# Altium footprint library smd-ipc.PCBLIB: 363 footprints (part 8 of 27)
Each footprint in its own frame and in the unit in brackets; x right, y up, seen from the top. Pads: shape width x height; smd on the part's side, far side on the other; paste and mask are expansions set on the pad; w line width, h text height; cw(c..) or ccw(c..) is an arc to the next point about the centre after c.
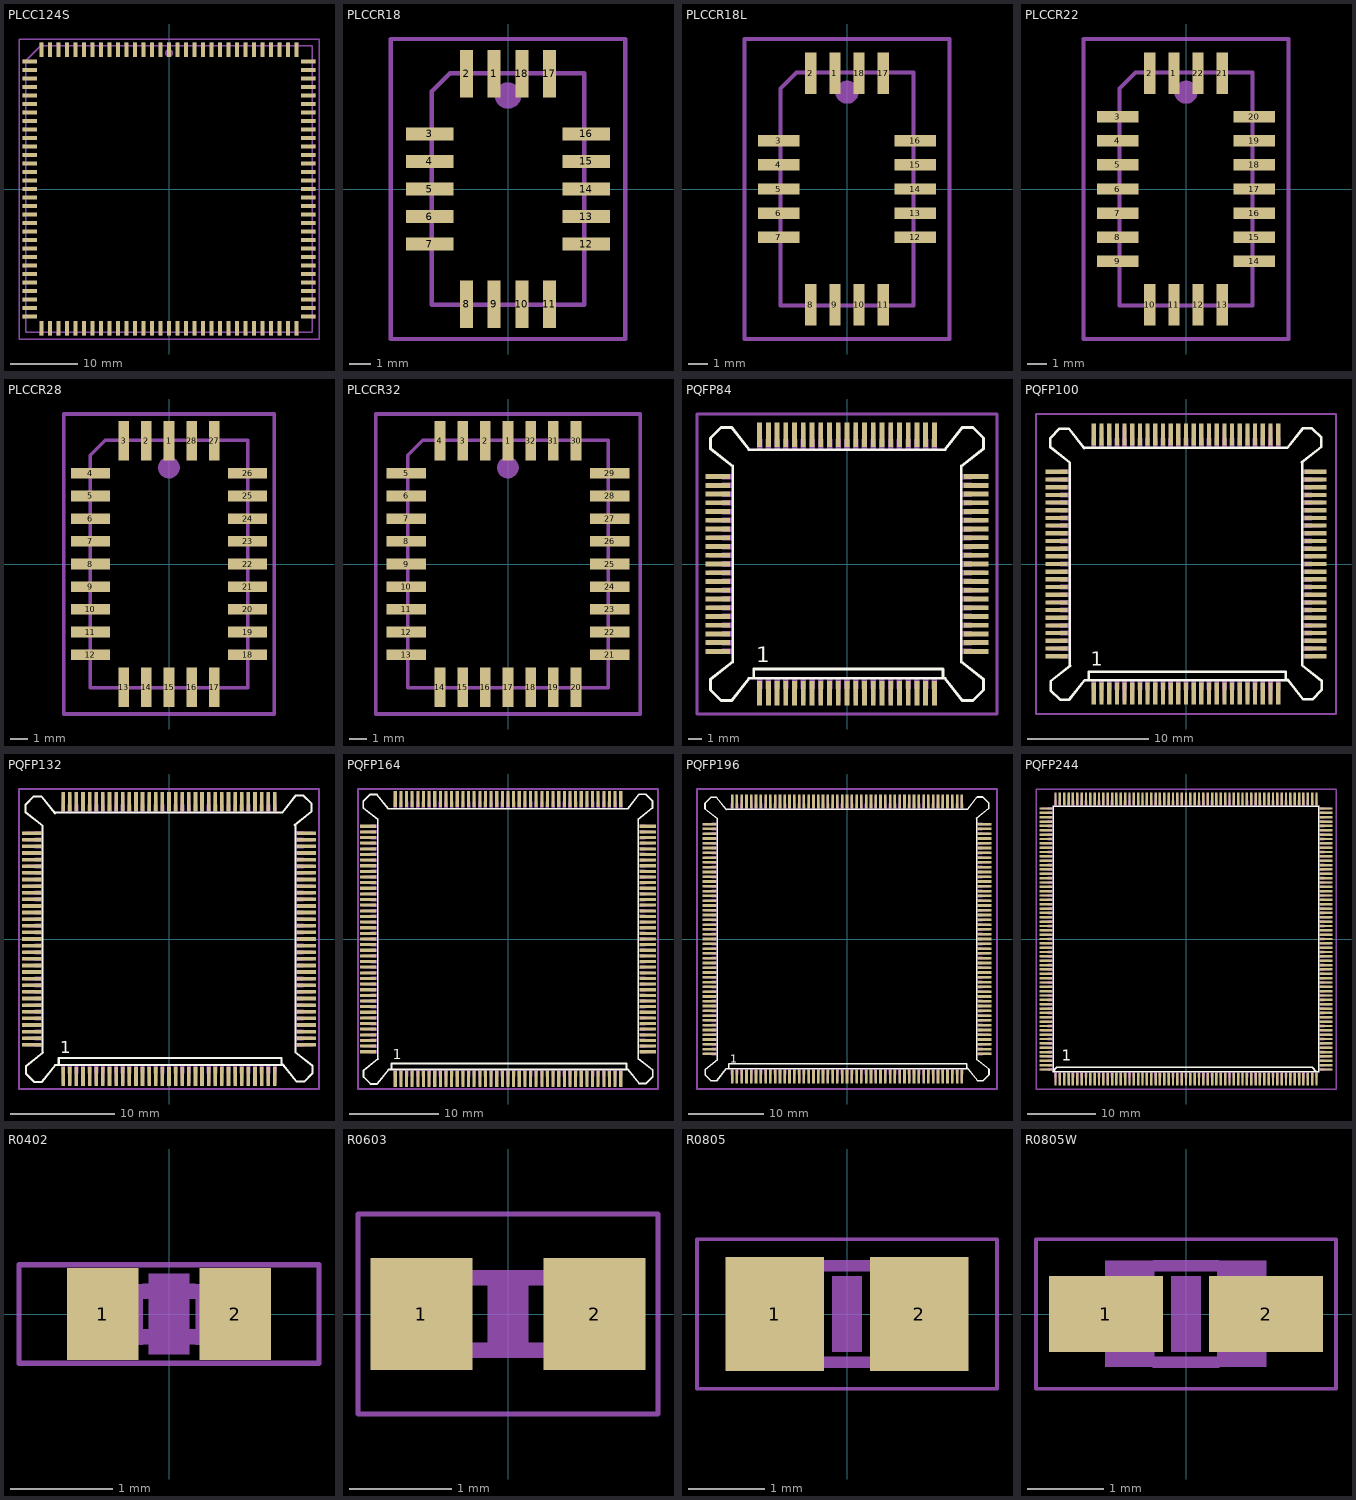
[diagram p7: the footprints below, top view; thin cyan lines are the x and y axes]

## PLCC124S [mm]
pads (124):
  rect 0.6x2.2 smd: 1(0,20.8) 2(-1.27,20.8) 3(-2.54,20.8) 4(-3.81,20.8) 5(-5.08,20.8) 6(-6.35,20.8) 7(-7.62,20.8) 8(-8.89,20.8) 9(-10.16,20.8) 10(-11.43,20.8) 11(-12.7,20.8) 12(-13.97,20.8) 13(-15.24,20.8) 14(-16.51,20.8) 15(-17.78,20.8) 16(-19.05,20.8) 48(-19.05,-20.8) 49(-17.78,-20.8) 50(-16.51,-20.8) 51(-15.24,-20.8) 52(-13.97,-20.8) 53(-12.7,-20.8) 54(-11.43,-20.8) 55(-10.16,-20.8) 56(-8.89,-20.8) 57(-7.62,-20.8) 58(-6.35,-20.8) 59(-5.08,-20.8) 60(-3.81,-20.8) 61(-2.54,-20.8) 62(-1.27,-20.8) 63(0,-20.8) 64(1.27,-20.8) 65(2.54,-20.8) 66(3.81,-20.8) 67(5.08,-20.8) 68(6.35,-20.8) 69(7.62,-20.8) 70(8.89,-20.8) 71(10.16,-20.8) 72(11.43,-20.8) 73(12.7,-20.8) 74(13.97,-20.8) 75(15.24,-20.8) 76(16.51,-20.8) 77(17.78,-20.8) 78(19.05,-20.8) 110(19.05,20.8) 111(17.78,20.8) 112(16.51,20.8) 113(15.24,20.8) 114(13.97,20.8) 115(12.7,20.8) 116(11.43,20.8) 117(10.16,20.8) 118(8.89,20.8) 119(7.62,20.8) 120(6.35,20.8) 121(5.08,20.8) 122(3.81,20.8) 123(2.54,20.8) 124(1.27,20.8)
  rect 2.2x0.6 smd: 17(-20.8,19.05) 18(-20.8,17.78) 19(-20.8,16.51) 20(-20.8,15.24) 21(-20.8,13.97) 22(-20.8,12.7) 23(-20.8,11.43) 24(-20.8,10.16) 25(-20.8,8.89) 26(-20.8,7.62) 27(-20.8,6.35) 28(-20.8,5.08) 29(-20.8,3.81) 30(-20.8,2.54) 31(-20.8,1.27) 32(-20.8,0) 33(-20.8,-1.27) 34(-20.8,-2.54) 35(-20.8,-3.81) 36(-20.8,-5.08) 37(-20.8,-6.35) 38(-20.8,-7.62) 39(-20.8,-8.89) 40(-20.8,-10.16) 41(-20.8,-11.43) 42(-20.8,-12.7) 43(-20.8,-13.97) 44(-20.8,-15.24) 45(-20.8,-16.51) 46(-20.8,-17.78) 47(-20.8,-19.05) 79(20.8,-19.05) 80(20.8,-17.78) 81(20.8,-16.51) 82(20.8,-15.24) 83(20.8,-13.97) 84(20.8,-12.7) 85(20.8,-11.43) 86(20.8,-10.16) 87(20.8,-8.89) 88(20.8,-7.62) 89(20.8,-6.35) 90(20.8,-5.08) 91(20.8,-3.81) 92(20.8,-2.54) 93(20.8,-1.27) 94(20.8,0) 95(20.8,1.27) 96(20.8,2.54) 97(20.8,3.81) 98(20.8,5.08) 99(20.8,6.35) 100(20.8,7.62) 101(20.8,8.89) 102(20.8,10.16) 103(20.8,11.43) 104(20.8,12.7) 105(20.8,13.97) 106(20.8,15.24) 107(20.8,16.51) 108(20.8,17.78) 109(20.8,19.05)
Mechanical 16:
  circle w0.61: c0,20.3 r0.3
  rectangle: -0.26,21.45 0.26,21.9
  rectangle: -1.53,21.45 -1.01,21.9
  rectangle: -2.8,21.45 -2.28,21.9
  rectangle: -4.07,21.45 -3.55,21.9
  rectangle: -5.34,21.45 -4.82,21.9
  rectangle: -6.61,21.45 -6.09,21.9
  rectangle: -7.88,21.45 -7.36,21.9
  rectangle: -9.15,21.45 -8.63,21.9
  rectangle: -10.42,21.45 -9.9,21.9
  rectangle: -11.69,21.45 -11.17,21.9
  rectangle: -12.96,21.45 -12.44,21.9
  rectangle: -14.23,21.45 -13.71,21.9
  rectangle: -15.5,21.45 -14.98,21.9
  rectangle: -16.77,21.45 -16.25,21.9
  rectangle: -18.04,21.45 -17.52,21.9
  rectangle: -19.31,21.45 -18.79,21.9
  rectangle: -21.9,18.79 -21.45,19.31
  rectangle: -21.9,17.52 -21.45,18.04
  rectangle: -21.9,16.25 -21.45,16.77
  rectangle: -21.9,14.98 -21.45,15.5
  rectangle: -21.9,13.71 -21.45,14.23
  rectangle: -21.9,12.44 -21.45,12.96
  rectangle: -21.9,11.17 -21.45,11.69
  rectangle: -21.9,9.9 -21.45,10.42
  rectangle: -21.9,8.63 -21.45,9.15
  rectangle: -21.9,7.36 -21.45,7.88
  rectangle: -21.9,6.09 -21.45,6.61
  rectangle: -21.9,4.82 -21.45,5.34
  rectangle: -21.9,3.55 -21.45,4.07
  rectangle: -21.9,2.28 -21.45,2.8
  rectangle: -21.9,1.01 -21.45,1.53
  rectangle: -21.9,-0.26 -21.45,0.26
  rectangle: -21.9,-1.53 -21.45,-1.01
  rectangle: -21.9,-2.8 -21.45,-2.28
  rectangle: -21.9,-4.07 -21.45,-3.55
  rectangle: -21.9,-5.34 -21.45,-4.82
  rectangle: -21.9,-6.61 -21.45,-6.09
  rectangle: -21.9,-7.88 -21.45,-7.36
  rectangle: -21.9,-9.15 -21.45,-8.63
  rectangle: -21.9,-10.42 -21.45,-9.9
  rectangle: -21.9,-11.69 -21.45,-11.17
  rectangle: -21.9,-12.96 -21.45,-12.44
  rectangle: -21.9,-14.23 -21.45,-13.71
  rectangle: -21.9,-15.5 -21.45,-14.98
  rectangle: -21.9,-16.77 -21.45,-16.25
  rectangle: -21.9,-18.04 -21.45,-17.52
  rectangle: -21.9,-19.31 -21.45,-18.79
  rectangle: -19.31,-21.9 -18.79,-21.45
  rectangle: -18.04,-21.9 -17.52,-21.45
  rectangle: -16.77,-21.9 -16.25,-21.45
  rectangle: -15.5,-21.9 -14.98,-21.45
  rectangle: -14.23,-21.9 -13.71,-21.45
  rectangle: -12.96,-21.9 -12.44,-21.45
  rectangle: -11.69,-21.9 -11.17,-21.45
  rectangle: -10.42,-21.9 -9.9,-21.45
  rectangle: -9.15,-21.9 -8.63,-21.45
  rectangle: -7.88,-21.9 -7.36,-21.45
  rectangle: -6.61,-21.9 -6.09,-21.45
  rectangle: -5.34,-21.9 -4.82,-21.45
  rectangle: -4.07,-21.9 -3.55,-21.45
  rectangle: -2.8,-21.9 -2.28,-21.45
  rectangle: -1.53,-21.9 -1.01,-21.45
  rectangle: -0.26,-21.9 0.26,-21.45
  rectangle: 1.01,-21.9 1.53,-21.45
  rectangle: 2.28,-21.9 2.8,-21.45
  rectangle: 3.55,-21.9 4.07,-21.45
  rectangle: 4.82,-21.9 5.34,-21.45
  rectangle: 6.09,-21.9 6.61,-21.45
  rectangle: 7.36,-21.9 7.88,-21.45
  rectangle: 8.63,-21.9 9.15,-21.45
  rectangle: 9.9,-21.9 10.42,-21.45
  rectangle: 11.17,-21.9 11.69,-21.45
  rectangle: 12.44,-21.9 12.96,-21.45
  rectangle: 13.71,-21.9 14.23,-21.45
  rectangle: 14.98,-21.9 15.5,-21.45
  rectangle: 16.25,-21.9 16.77,-21.45
  rectangle: 17.52,-21.9 18.04,-21.45
  rectangle: 18.79,-21.9 19.31,-21.45
  rectangle: 21.45,-19.31 21.9,-18.79
  rectangle: 21.45,-18.04 21.9,-17.52
  rectangle: 21.45,-16.77 21.9,-16.25
  rectangle: 21.45,-15.5 21.9,-14.98
  rectangle: 21.45,-14.23 21.9,-13.71
  rectangle: 21.45,-12.96 21.9,-12.44
  rectangle: 21.45,-11.69 21.9,-11.17
  rectangle: 21.45,-10.42 21.9,-9.9
  rectangle: 21.45,-9.15 21.9,-8.63
  rectangle: 21.45,-7.88 21.9,-7.36
  rectangle: 21.45,-6.61 21.9,-6.09
  rectangle: 21.45,-5.34 21.9,-4.82
  rectangle: 21.45,-4.07 21.9,-3.55
  rectangle: 21.45,-2.8 21.9,-2.28
  rectangle: 21.45,-1.53 21.9,-1.01
  rectangle: 21.45,-0.26 21.9,0.26
  rectangle: 21.45,1.01 21.9,1.53
  rectangle: 21.45,2.28 21.9,2.8
  rectangle: 21.45,3.55 21.9,4.07
  rectangle: 21.45,4.82 21.9,5.34
  rectangle: 21.45,6.09 21.9,6.61
  rectangle: 21.45,7.36 21.9,7.88
  rectangle: 21.45,8.63 21.9,9.15
  rectangle: 21.45,9.9 21.9,10.42
  rectangle: 21.45,11.17 21.9,11.69
  rectangle: 21.45,12.44 21.9,12.96
  rectangle: 21.45,13.71 21.9,14.23
  rectangle: 21.45,14.98 21.9,15.5
  rectangle: 21.45,16.25 21.9,16.77
  rectangle: 21.45,17.52 21.9,18.04
  rectangle: 21.45,18.79 21.9,19.31
  rectangle: 18.79,21.45 19.31,21.9
  rectangle: 17.52,21.45 18.04,21.9
  rectangle: 16.25,21.45 16.77,21.9
  rectangle: 14.98,21.45 15.5,21.9
  rectangle: 13.71,21.45 14.23,21.9
  rectangle: 12.44,21.45 12.96,21.9
  rectangle: 11.17,21.45 11.69,21.9
  rectangle: 9.9,21.45 10.42,21.9
  rectangle: 8.63,21.45 9.15,21.9
  rectangle: 7.36,21.45 7.88,21.9
  rectangle: 6.09,21.45 6.61,21.9
  rectangle: 4.82,21.45 5.34,21.9
  rectangle: 3.55,21.45 4.07,21.9
  rectangle: 2.28,21.45 2.8,21.9
  rectangle: 1.01,21.45 1.53,21.9
  lines w0.203: -21.4,-21.4 -21.4,19.165 -19.165,21.4 21.4,21.4 21.4,-21.4 -21.4,-21.4
Mechanical 27:
  lines w0.2: -22.403,-22.403 22.403,-22.403 22.403,22.403 -22.403,22.403 -22.403,-22.403

## PLCCR18 [mm]
pads (18):
  rect 0.6x2.2 smd: 1(-0.635,5.3) 2(-1.905,5.3) 8(-1.905,-5.3) 9(-0.635,-5.3) 10(0.635,-5.3) 11(1.905,-5.3) 17(1.905,5.3) 18(0.635,5.3)
  rect 2.2x0.6 smd: 3(-3.6,2.54) 4(-3.6,1.27) 5(-3.6,0) 6(-3.6,-1.27) 7(-3.6,-2.54) 12(3.6,-2.54) 13(3.6,-1.27) 14(3.6,0) 15(3.6,1.27) 16(3.6,2.54)
Mechanical 16:
  circle w0.61: c0,4.3 r0.3
  rectangle: -0.895,5.35 -0.365,5.93
  rectangle: -2.165,5.35 -1.635,5.93
  rectangle: -4.23,2.28 -3.65,2.81
  rectangle: -4.23,1.01 -3.65,1.54
  rectangle: -4.23,-0.26 -3.65,0.27
  rectangle: -4.23,-1.53 -3.65,-1
  rectangle: -4.23,-2.8 -3.65,-2.27
  rectangle: -2.175,-5.93 -1.645,-5.35
  rectangle: -0.905,-5.93 -0.375,-5.35
  rectangle: 0.365,-5.93 0.895,-5.35
  rectangle: 1.635,-5.93 2.165,-5.35
  rectangle: 3.65,-2.81 4.23,-2.28
  rectangle: 3.65,-1.54 4.23,-1.01
  rectangle: 3.65,-0.27 4.23,0.26
  rectangle: 3.65,1 4.23,1.53
  rectangle: 3.65,2.27 4.23,2.8
  rectangle: 1.645,5.35 2.175,5.93
  rectangle: 0.375,5.35 0.905,5.93
  lines w0.203: -3.51,-5.33 3.51,-5.33 3.51,5.33 -2.67,5.33 -3.51,4.49 -3.51,-5.33
Mechanical 27:
  lines w0.2: -5.403,-6.903 5.403,-6.903 5.403,6.903 -5.403,6.903 -5.403,-6.903

## PLCCR18L [mm]
pads (18):
  rect 0.6x2.2 smd: 1(-0.635,6.1) 2(-1.905,6.1) 8(-1.905,-6.1) 9(-0.635,-6.1) 10(0.635,-6.1) 11(1.905,-6.1) 17(1.905,6.1) 18(0.635,6.1)
  rect 2.2x0.6 smd: 3(-3.6,2.54) 4(-3.6,1.27) 5(-3.6,0) 6(-3.6,-1.27) 7(-3.6,-2.54) 12(3.6,-2.54) 13(3.6,-1.27) 14(3.6,0) 15(3.6,1.27) 16(3.6,2.54)
Mechanical 16:
  circle w0.61: c0,5.1 r0.3
  rectangle: -0.895,6.15 -0.365,6.73
  rectangle: -2.165,6.15 -1.635,6.73
  rectangle: -4.23,2.28 -3.65,2.81
  rectangle: -4.23,1.01 -3.65,1.54
  rectangle: -4.23,-0.26 -3.65,0.27
  rectangle: -4.23,-1.53 -3.65,-1
  rectangle: -4.23,-2.8 -3.65,-2.27
  rectangle: -2.175,-6.73 -1.645,-6.15
  rectangle: -0.905,-6.73 -0.375,-6.15
  rectangle: 0.365,-6.73 0.895,-6.15
  rectangle: 1.635,-6.73 2.165,-6.15
  rectangle: 3.65,-2.81 4.23,-2.28
  rectangle: 3.65,-1.54 4.23,-1.01
  rectangle: 3.65,-0.27 4.23,0.26
  rectangle: 3.65,1 4.23,1.53
  rectangle: 3.65,2.27 4.23,2.8
  rectangle: 1.645,6.15 2.175,6.73
  rectangle: 0.375,6.15 0.905,6.73
  lines w0.203: -3.51,-6.13 3.51,-6.13 3.51,6.13 -2.67,6.13 -3.51,5.29 -3.51,-6.13
Mechanical 27:
  lines w0.2: -5.403,-7.903 5.403,-7.903 5.403,7.903 -5.403,7.903 -5.403,-7.903

## PLCCR22 [mm]
pads (22):
  rect 0.6x2.2 smd: 1(-0.635,6.1) 2(-1.905,6.1) 10(-1.905,-6.1) 11(-0.635,-6.1) 12(0.635,-6.1) 13(1.905,-6.1) 21(1.905,6.1) 22(0.635,6.1)
  rect 2.2x0.6 smd: 3(-3.6,3.81) 4(-3.6,2.54) 5(-3.6,1.27) 6(-3.6,0) 7(-3.6,-1.27) 8(-3.6,-2.54) 9(-3.6,-3.81) 14(3.6,-3.81) 15(3.6,-2.54) 16(3.6,-1.27) 17(3.6,0) 18(3.6,1.27) 19(3.6,2.54) 20(3.6,3.81)
Mechanical 16:
  circle w0.61: c0,5.1 r0.3
  rectangle: -0.895,6.15 -0.365,6.73
  rectangle: -2.165,6.15 -1.635,6.73
  rectangle: -4.23,3.55 -3.65,4.08
  rectangle: -4.23,2.28 -3.65,2.81
  rectangle: -4.23,1.01 -3.65,1.54
  rectangle: -4.23,-0.26 -3.65,0.27
  rectangle: -4.23,-1.53 -3.65,-1
  rectangle: -4.23,-2.8 -3.65,-2.27
  rectangle: -4.23,-4.07 -3.65,-3.54
  rectangle: -2.175,-6.73 -1.645,-6.15
  rectangle: -0.905,-6.73 -0.375,-6.15
  rectangle: 0.365,-6.73 0.895,-6.15
  rectangle: 1.635,-6.73 2.165,-6.15
  rectangle: 3.65,-4.08 4.23,-3.55
  rectangle: 3.65,-2.81 4.23,-2.28
  rectangle: 3.65,-1.54 4.23,-1.01
  rectangle: 3.65,-0.27 4.23,0.26
  rectangle: 3.65,1 4.23,1.53
  rectangle: 3.65,2.27 4.23,2.8
  rectangle: 3.65,3.54 4.23,4.07
  rectangle: 1.645,6.15 2.175,6.73
  rectangle: 0.375,6.15 0.905,6.73
  lines w0.203: -3.51,-6.13 3.51,-6.13 3.51,6.13 -2.67,6.13 -3.51,5.29 -3.51,-6.13
Mechanical 27:
  lines w0.2: -5.403,-7.903 5.403,-7.903 5.403,7.903 -5.403,7.903 -5.403,-7.903

## PLCCR28 [mm]
pads (28):
  rect 0.6x2.2 smd: 1(0,6.9) 2(-1.27,6.9) 3(-2.54,6.9) 13(-2.54,-6.9) 14(-1.27,-6.9) 15(0,-6.9) 16(1.27,-6.9) 17(2.54,-6.9) 27(2.54,6.9) 28(1.27,6.9)
  rect 2.2x0.6 smd: 4(-4.4,5.08) 5(-4.4,3.81) 6(-4.4,2.54) 7(-4.4,1.27) 8(-4.4,0) 9(-4.4,-1.27) 10(-4.4,-2.54) 11(-4.4,-3.81) 12(-4.4,-5.08) 18(4.4,-5.08) 19(4.4,-3.81) 20(4.4,-2.54) 21(4.4,-1.27) 22(4.4,0) 23(4.4,1.27) 24(4.4,2.54) 25(4.4,3.81) 26(4.4,5.08)
Mechanical 16:
  circle w0.61: c0,5.4 r0.3
  rectangle: -0.26,6.95 0.27,7.53
  rectangle: -1.53,6.95 -1,7.53
  rectangle: -2.8,6.95 -2.27,7.53
  rectangle: -5.03,4.82 -4.45,5.35
  rectangle: -5.03,3.55 -4.45,4.08
  rectangle: -5.03,2.28 -4.45,2.81
  rectangle: -5.03,1.01 -4.45,1.54
  rectangle: -5.03,-0.26 -4.45,0.27
  rectangle: -5.03,-1.53 -4.45,-1
  rectangle: -5.03,-2.8 -4.45,-2.27
  rectangle: -5.03,-4.07 -4.45,-3.54
  rectangle: -5.03,-5.34 -4.45,-4.81
  rectangle: -2.81,-7.53 -2.28,-6.95
  rectangle: -1.54,-7.53 -1.01,-6.95
  rectangle: -0.27,-7.53 0.26,-6.95
  rectangle: 1,-7.53 1.53,-6.95
  rectangle: 2.27,-7.53 2.8,-6.95
  rectangle: 4.45,-5.35 5.03,-4.82
  rectangle: 4.45,-4.08 5.03,-3.55
  rectangle: 4.45,-2.81 5.03,-2.28
  rectangle: 4.45,-1.54 5.03,-1.01
  rectangle: 4.45,-0.27 5.03,0.26
  rectangle: 4.45,1 5.03,1.53
  rectangle: 4.45,2.27 5.03,2.8
  rectangle: 4.45,3.54 5.03,4.07
  rectangle: 4.45,4.81 5.03,5.34
  rectangle: 2.28,6.95 2.81,7.53
  rectangle: 1.01,6.95 1.54,7.53
  lines w0.203: -4.41,-6.93 4.41,-6.93 4.41,6.93 -3.57,6.93 -4.41,6.09 -4.41,-6.93
Mechanical 27:
  lines w0.2: -5.903,-8.403 5.903,-8.403 5.903,8.403 -5.903,8.403 -5.903,-8.403

## PLCCR32 [mm]
pads (32):
  rect 0.6x2.2 smd: 1(0,6.9) 2(-1.27,6.9) 3(-2.54,6.9) 4(-3.81,6.9) 14(-3.81,-6.9) 15(-2.54,-6.9) 16(-1.27,-6.9) 17(0,-6.9) 18(1.27,-6.9) 19(2.54,-6.9) 20(3.81,-6.9) 30(3.81,6.9) 31(2.54,6.9) 32(1.27,6.9)
  rect 2.2x0.6 smd: 5(-5.7,5.08) 6(-5.7,3.81) 7(-5.7,2.54) 8(-5.7,1.27) 9(-5.7,0) 10(-5.7,-1.27) 11(-5.7,-2.54) 12(-5.7,-3.81) 13(-5.7,-5.08) 21(5.7,-5.08) 22(5.7,-3.81) 23(5.7,-2.54) 24(5.7,-1.27) 25(5.7,0) 26(5.7,1.27) 27(5.7,2.54) 28(5.7,3.81) 29(5.7,5.08)
Mechanical 16:
  circle w0.61: c0,5.4 r0.3
  rectangle: -0.26,6.95 0.27,7.53
  rectangle: -1.53,6.95 -1,7.53
  rectangle: -2.8,6.95 -2.27,7.53
  rectangle: -4.07,6.95 -3.54,7.53
  rectangle: -6.33,4.82 -5.75,5.35
  rectangle: -6.33,3.55 -5.75,4.08
  rectangle: -6.33,2.28 -5.75,2.81
  rectangle: -6.33,1.01 -5.75,1.54
  rectangle: -6.33,-0.26 -5.75,0.27
  rectangle: -6.33,-1.53 -5.75,-1
  rectangle: -6.33,-2.8 -5.75,-2.27
  rectangle: -6.33,-4.07 -5.75,-3.54
  rectangle: -6.33,-5.34 -5.75,-4.81
  rectangle: -4.08,-7.53 -3.55,-6.95
  rectangle: -2.81,-7.53 -2.28,-6.95
  rectangle: -1.54,-7.53 -1.01,-6.95
  rectangle: -0.27,-7.53 0.26,-6.95
  rectangle: 1,-7.53 1.53,-6.95
  rectangle: 2.27,-7.53 2.8,-6.95
  rectangle: 3.54,-7.53 4.07,-6.95
  rectangle: 5.75,-5.35 6.33,-4.82
  rectangle: 5.75,-4.08 6.33,-3.55
  rectangle: 5.75,-2.81 6.33,-2.28
  rectangle: 5.75,-1.54 6.33,-1.01
  rectangle: 5.75,-0.27 6.33,0.26
  rectangle: 5.75,1 6.33,1.53
  rectangle: 5.75,2.27 6.33,2.8
  rectangle: 5.75,3.54 6.33,4.07
  rectangle: 5.75,4.81 6.33,5.34
  rectangle: 3.55,6.95 4.08,7.53
  rectangle: 2.28,6.95 2.81,7.53
  rectangle: 1.01,6.95 1.54,7.53
  lines w0.203: -5.61,-6.93 5.61,-6.93 5.61,6.93 -4.77,6.93 -5.61,6.09 -5.61,-6.93
Mechanical 27:
  lines w0.2: -7.403,-8.403 7.403,-8.403 7.403,8.403 -7.403,8.403 -7.403,-8.403

## PQFP84 [mm]
pads (84):
  rect 0.35x1.8 smd: 1(-6.35,-9.4) 2(-5.715,-9.4) 3(-5.08,-9.4) 4(-4.445,-9.4) 5(-3.81,-9.4) 6(-3.175,-9.4) 7(-2.54,-9.4) 8(-1.905,-9.4) 9(-1.27,-9.4) 10(-0.635,-9.4) 11(0,-9.4) 12(0.635,-9.4) 13(1.27,-9.4) 14(1.905,-9.4) 15(2.54,-9.4) 16(3.175,-9.4) 17(3.81,-9.4) 18(4.445,-9.4) 19(5.08,-9.4) 20(5.715,-9.4) 21(6.35,-9.4) 43(6.35,9.4) 44(5.715,9.4) 45(5.08,9.4) 46(4.445,9.4) 47(3.81,9.4) 48(3.175,9.4) 49(2.54,9.4) 50(1.905,9.4) 51(1.27,9.4) 52(0.635,9.4) 53(0,9.4) 54(-0.635,9.4) 55(-1.27,9.4) 56(-1.905,9.4) 57(-2.54,9.4) 58(-3.175,9.4) 59(-3.81,9.4) 60(-4.445,9.4) 61(-5.08,9.4) 62(-5.715,9.4) 63(-6.35,9.4)
  rect 1.8x0.35 smd: 22(9.4,-6.35) 23(9.4,-5.715) 24(9.4,-5.08) 25(9.4,-4.445) 26(9.4,-3.81) 27(9.4,-3.175) 28(9.4,-2.54) 29(9.4,-1.905) 30(9.4,-1.27) 31(9.4,-0.635) 32(9.4,0) 33(9.4,0.635) 34(9.4,1.27) 35(9.4,1.905) 36(9.4,2.54) 37(9.4,3.175) 38(9.4,3.81) 39(9.4,4.445) 40(9.4,5.08) 41(9.4,5.715) 42(9.4,6.35) 64(-9.4,6.35) 65(-9.4,5.715) 66(-9.4,5.08) 67(-9.4,4.445) 68(-9.4,3.81) 69(-9.4,3.175) 70(-9.4,2.54) 71(-9.4,1.905) 72(-9.4,1.27) 73(-9.4,0.635) 74(-9.4,0) 75(-9.4,-0.635) 76(-9.4,-1.27) 77(-9.4,-1.905) 78(-9.4,-2.54) 79(-9.4,-3.175) 80(-9.4,-3.81) 81(-9.4,-4.445) 82(-9.4,-5.08) 83(-9.4,-5.715) 84(-9.4,-6.35)
Top Overlay:
  lines w0.203: -9.92,-8.382 -9.92,-9.144 -9.144,-9.906 ; -9.92,8.382 -9.92,9.144 ; -9.906,-8.382 -8.3,-7.112 -8.3,7.112 -9.906,8.382 ; -9.906,9.144 -9.144,9.92 -8.382,9.92 ; -9.144,-9.92 -8.382,-9.92 ; -8.382,-9.906 -7.112,-8.3 -6.776,-8.3 ; -8.382,9.906 -7.112,8.3 7.112,8.3 8.382,9.906 ; 6.985,-8.255 6.985,-7.62 -6.776,-7.62 -6.776,-8.3 ; 8.382,-9.92 9.144,-9.92 9.906,-9.144 ; 8.382,-9.906 7.112,-8.3 -6.776,-8.3 ; 8.382,9.92 9.144,9.92 ; 9.144,9.906 9.92,9.144 9.92,8.382 ; 9.906,-8.382 8.3,-7.112 8.3,7.112 9.906,8.382 ; 9.92,-9.144 9.92,-8.382
  text "1" at -6.61,-7.53 h1.97
Mechanical 16:
  drawing of 168 lines, arcs and shapes, not listed
Mechanical 27:
  lines w0.2: -10.9,-10.9 -10.9,10.9 10.9,10.9 10.9,-10.9 -10.9,-10.9

## PQFP100 [mm]
pads (100):
  rect 0.35x1.8 smd: 1(-7.62,-10.7) 2(-6.985,-10.7) 3(-6.35,-10.7) 4(-5.715,-10.7) 5(-5.08,-10.7) 6(-4.445,-10.7) 7(-3.81,-10.7) 8(-3.175,-10.7) 9(-2.54,-10.7) 10(-1.905,-10.7) 11(-1.27,-10.7) 12(-0.635,-10.7) 13(0,-10.7) 14(0.635,-10.7) 15(1.27,-10.7) 16(1.905,-10.7) 17(2.54,-10.7) 18(3.175,-10.7) 19(3.81,-10.7) 20(4.445,-10.7) 21(5.08,-10.7) 22(5.715,-10.7) 23(6.35,-10.7) 24(6.985,-10.7) 25(7.62,-10.7) 51(7.62,10.7) 52(6.985,10.7) 53(6.35,10.7) 54(5.715,10.7) 55(5.08,10.7) 56(4.445,10.7) 57(3.81,10.7) 58(3.175,10.7) 59(2.54,10.7) 60(1.905,10.7) 61(1.27,10.7) 62(0.635,10.7) 63(0,10.7) 64(-0.635,10.7) 65(-1.27,10.7) 66(-1.905,10.7) 67(-2.54,10.7) 68(-3.175,10.7) 69(-3.81,10.7) 70(-4.445,10.7) 71(-5.08,10.7) 72(-5.715,10.7) 73(-6.35,10.7) 74(-6.985,10.7) 75(-7.62,10.7)
  rect 1.8x0.35 smd: 26(10.7,-7.62) 27(10.7,-6.985) 28(10.7,-6.35) 29(10.7,-5.715) 30(10.7,-5.08) 31(10.7,-4.445) 32(10.7,-3.81) 33(10.7,-3.175) 34(10.7,-2.54) 35(10.7,-1.905) 36(10.7,-1.27) 37(10.7,-0.635) 38(10.7,0) 39(10.7,0.635) 40(10.7,1.27) 41(10.7,1.905) 42(10.7,2.54) 43(10.7,3.175) 44(10.7,3.81) 45(10.7,4.445) 46(10.7,5.08) 47(10.7,5.715) 48(10.7,6.35) 49(10.7,6.985) 50(10.7,7.62) 76(-10.7,7.62) 77(-10.7,6.985) 78(-10.7,6.35) 79(-10.7,5.715) 80(-10.7,5.08) 81(-10.7,4.445) 82(-10.7,3.81) 83(-10.7,3.175) 84(-10.7,2.54) 85(-10.7,1.905) 86(-10.7,1.27) 87(-10.7,0.635) 88(-10.7,0) 89(-10.7,-0.635) 90(-10.7,-1.27) 91(-10.7,-1.905) 92(-10.7,-2.54) 93(-10.7,-3.175) 94(-10.7,-3.81) 95(-10.7,-4.445) 96(-10.7,-5.08) 97(-10.7,-5.715) 98(-10.7,-6.35) 99(-10.7,-6.985) 100(-10.7,-7.62)
Top Overlay:
  lines w0.203: -11.22,9.652 -11.22,10.414 ; -11.206,9.652 -9.6,8.382 ; -11.206,10.414 -10.444,11.19 -9.682,11.19 ; -11.19,-9.682 -11.19,-10.444 -10.414,-11.206 ; -11.176,-9.682 -9.57,-8.412 ; -10.414,-11.22 -9.652,-11.22 ; -9.682,11.176 -8.412,9.57 ; -9.652,-11.206 -8.382,-9.6 -8.046,-9.6 ; -9.6,-8.382 -9.6,8.3 ; -8.382,9.6 8.3,9.6 ; 8.255,-9.555 8.255,-8.92 -8.046,-8.92 -8.046,-9.6 ; 8.382,-9.6 -8.046,-9.6 ; 8.382,9.6 9.652,11.206 ; 8.412,-9.57 9.682,-11.176 ; 9.57,8.412 11.176,9.682 ; 9.6,-8.382 11.206,-9.652 ; 9.6,-8.3 9.6,8.382 ; 9.652,11.22 10.414,11.22 ; 9.682,-11.19 10.444,-11.19 11.206,-10.414 ; 10.414,11.206 11.19,10.444 11.19,9.682 ; 11.22,-10.414 11.22,-9.652
  text "1" at -7.88,-8.83 h1.97
Mechanical 16:
  drawing of 200 lines, arcs and shapes, not listed
Mechanical 27:
  lines w0.2: -12.4,-12.4 -12.4,12.4 12.4,12.4 12.4,-12.4 -12.4,-12.4

## PQFP132 [mm]
pads (132):
  rect 0.35x1.8 smd: 1(-10.16,-13.2) 2(-9.525,-13.2) 3(-8.89,-13.2) 4(-8.255,-13.2) 5(-7.62,-13.2) 6(-6.985,-13.2) 7(-6.35,-13.2) 8(-5.715,-13.2) 9(-5.08,-13.2) 10(-4.445,-13.2) 11(-3.81,-13.2) 12(-3.175,-13.2) 13(-2.54,-13.2) 14(-1.905,-13.2) 15(-1.27,-13.2) 16(-0.635,-13.2) 17(0,-13.2) 18(0.635,-13.2) 19(1.27,-13.2) 20(1.905,-13.2) 21(2.54,-13.2) 22(3.175,-13.2) 23(3.81,-13.2) 24(4.445,-13.2) 25(5.08,-13.2) 26(5.715,-13.2) 27(6.35,-13.2) 28(6.985,-13.2) 29(7.62,-13.2) 30(8.255,-13.2) 31(8.89,-13.2) 32(9.525,-13.2) 33(10.16,-13.2) 67(10.16,13.2) 68(9.525,13.2) 69(8.89,13.2) 70(8.255,13.2) 71(7.62,13.2) 72(6.985,13.2) 73(6.35,13.2) 74(5.715,13.2) 75(5.08,13.2) 76(4.445,13.2) 77(3.81,13.2) 78(3.175,13.2) 79(2.54,13.2) 80(1.905,13.2) 81(1.27,13.2) 82(0.635,13.2) 83(0,13.2) 84(-0.635,13.2) 85(-1.27,13.2) 86(-1.905,13.2) 87(-2.54,13.2) 88(-3.175,13.2) 89(-3.81,13.2) 90(-4.445,13.2) 91(-5.08,13.2) 92(-5.715,13.2) 93(-6.35,13.2) 94(-6.985,13.2) 95(-7.62,13.2) 96(-8.255,13.2) 97(-8.89,13.2) 98(-9.525,13.2) 99(-10.16,13.2)
  rect 1.8x0.35 smd: 34(13.2,-10.16) 35(13.2,-9.525) 36(13.2,-8.89) 37(13.2,-8.255) 38(13.2,-7.62) 39(13.2,-6.985) 40(13.2,-6.35) 41(13.2,-5.715) 42(13.2,-5.08) 43(13.2,-4.445) 44(13.2,-3.81) 45(13.2,-3.175) 46(13.2,-2.54) 47(13.2,-1.905) 48(13.2,-1.27) 49(13.2,-0.635) 50(13.2,0) 51(13.2,0.635) 52(13.2,1.27) 53(13.2,1.905) 54(13.2,2.54) 55(13.2,3.175) 56(13.2,3.81) 57(13.2,4.445) 58(13.2,5.08) 59(13.2,5.715) 60(13.2,6.35) 61(13.2,6.985) 62(13.2,7.62) 63(13.2,8.255) 64(13.2,8.89) 65(13.2,9.525) 66(13.2,10.16) 100(-13.2,10.16) 101(-13.2,9.525) 102(-13.2,8.89) 103(-13.2,8.255) 104(-13.2,7.62) 105(-13.2,6.985) 106(-13.2,6.35) 107(-13.2,5.715) 108(-13.2,5.08) 109(-13.2,4.445) 110(-13.2,3.81) 111(-13.2,3.175) 112(-13.2,2.54) 113(-13.2,1.905) 114(-13.2,1.27) 115(-13.2,0.635) 116(-13.2,0) 117(-13.2,-0.635) 118(-13.2,-1.27) 119(-13.2,-1.905) 120(-13.2,-2.54) 121(-13.2,-3.175) 122(-13.2,-3.81) 123(-13.2,-4.445) 124(-13.2,-5.08) 125(-13.2,-5.715) 126(-13.2,-6.35) 127(-13.2,-6.985) 128(-13.2,-7.62) 129(-13.2,-8.255) 130(-13.2,-8.89) 131(-13.2,-9.525) 132(-13.2,-10.16)
Top Overlay:
  lines w0.203: -13.76,12.152 -13.76,12.914 ; -13.746,12.152 -12.14,10.882 ; -13.746,12.914 -12.984,13.69 -12.222,13.69 ; -13.73,-12.182 -13.73,-12.944 -12.954,-13.706 ; -13.716,-12.182 -12.11,-10.912 ; -12.954,-13.72 -12.192,-13.72 ; -12.222,13.676 -10.952,12.07 ; -12.192,-13.706 -10.922,-12.1 -10.586,-12.1 ; -12.14,-10.962 -12.14,10.8 ; -10.962,12.14 10.8,12.14 ; 10.795,-12.055 10.795,-11.42 -10.586,-11.42 -10.586,-12.1 ; 10.882,12.14 12.152,13.746 ; 10.922,-12.1 -10.586,-12.1 ; 10.952,-12.07 12.222,-13.676 ; 12.07,10.952 13.676,12.222 ; 12.14,-10.882 13.746,-12.152 ; 12.14,-10.8 12.14,10.962 ; 12.152,13.76 12.914,13.76 ; 12.222,-13.69 12.984,-13.69 13.746,-12.914 ; 12.914,13.746 13.69,12.984 13.69,12.222 ; 13.76,-12.914 13.76,-12.152
  text "1" at -10.42,-11.33 h1.97
Mechanical 16:
  drawing of 264 lines, arcs and shapes, not listed
Mechanical 27:
  lines w0.2: -14.4,-14.4 -14.4,14.4 14.4,14.4 14.4,-14.4 -14.4,-14.4

## PQFP164 [mm]
pads (164):
  rect 0.35x1.8 smd: 1(-12.7,-15.8) 2(-12.065,-15.8) 3(-11.43,-15.8) 4(-10.795,-15.8) 5(-10.16,-15.8) 6(-9.525,-15.8) 7(-8.89,-15.8) 8(-8.255,-15.8) 9(-7.62,-15.8) 10(-6.985,-15.8) 11(-6.35,-15.8) 12(-5.715,-15.8) 13(-5.08,-15.8) 14(-4.445,-15.8) 15(-3.81,-15.8) 16(-3.175,-15.8) 17(-2.54,-15.8) 18(-1.905,-15.8) 19(-1.27,-15.8) 20(-0.635,-15.8) 21(0,-15.8) 22(0.635,-15.8) 23(1.27,-15.8) 24(1.905,-15.8) 25(2.54,-15.8) 26(3.175,-15.8) 27(3.81,-15.8) 28(4.445,-15.8) 29(5.08,-15.8) 30(5.715,-15.8) 31(6.35,-15.8) 32(6.985,-15.8) 33(7.62,-15.8) 34(8.255,-15.8) 35(8.89,-15.8) 36(9.525,-15.8) 37(10.16,-15.8) 38(10.795,-15.8) 39(11.43,-15.8) 40(12.065,-15.8) 41(12.7,-15.8) 83(12.7,15.8) 84(12.065,15.8) 85(11.43,15.8) 86(10.795,15.8) 87(10.16,15.8) 88(9.525,15.8) 89(8.89,15.8) 90(8.255,15.8) 91(7.62,15.8) 92(6.985,15.8) 93(6.35,15.8) 94(5.715,15.8) 95(5.08,15.8) 96(4.445,15.8) 97(3.81,15.8) 98(3.175,15.8) 99(2.54,15.8) 100(1.905,15.8) 101(1.27,15.8) 102(0.635,15.8) 103(0,15.8) 104(-0.635,15.8) 105(-1.27,15.8) 106(-1.905,15.8) 107(-2.54,15.8) 108(-3.175,15.8) 109(-3.81,15.8) 110(-4.445,15.8) 111(-5.08,15.8) 112(-5.715,15.8) 113(-6.35,15.8) 114(-6.985,15.8) 115(-7.62,15.8) 116(-8.255,15.8) 117(-8.89,15.8) 118(-9.525,15.8) 119(-10.16,15.8) 120(-10.795,15.8) 121(-11.43,15.8) 122(-12.065,15.8) 123(-12.7,15.8)
  rect 1.8x0.35 smd: 42(15.8,-12.7) 43(15.8,-12.065) 44(15.8,-11.43) 45(15.8,-10.795) 46(15.8,-10.16) 47(15.8,-9.525) 48(15.8,-8.89) 49(15.8,-8.255) 50(15.8,-7.62) 51(15.8,-6.985) 52(15.8,-6.35) 53(15.8,-5.715) 54(15.8,-5.08) 55(15.8,-4.445) 56(15.8,-3.81) 57(15.8,-3.175) 58(15.8,-2.54) 59(15.8,-1.905) 60(15.8,-1.27) 61(15.8,-0.635) 62(15.8,0) 63(15.8,0.635) 64(15.8,1.27) 65(15.8,1.905) 66(15.8,2.54) 67(15.8,3.175) 68(15.8,3.81) 69(15.8,4.445) 70(15.8,5.08) 71(15.8,5.715) 72(15.8,6.35) 73(15.8,6.985) 74(15.8,7.62) 75(15.8,8.255) 76(15.8,8.89) 77(15.8,9.525) 78(15.8,10.16) 79(15.8,10.795) 80(15.8,11.43) 81(15.8,12.065) 82(15.8,12.7) 124(-15.8,12.7) 125(-15.8,12.065) 126(-15.8,11.43) 127(-15.8,10.795) 128(-15.8,10.16) 129(-15.8,9.525) 130(-15.8,8.89) 131(-15.8,8.255) 132(-15.8,7.62) 133(-15.8,6.985) 134(-15.8,6.35) 135(-15.8,5.715) 136(-15.8,5.08) 137(-15.8,4.445) 138(-15.8,3.81) 139(-15.8,3.175) 140(-15.8,2.54) 141(-15.8,1.905) 142(-15.8,1.27) 143(-15.8,0.635) 144(-15.8,0) 145(-15.8,-0.635) 146(-15.8,-1.27) 147(-15.8,-1.905) 148(-15.8,-2.54) 149(-15.8,-3.175) 150(-15.8,-3.81) 151(-15.8,-4.445) 152(-15.8,-5.08) 153(-15.8,-5.715) 154(-15.8,-6.35) 155(-15.8,-6.985) 156(-15.8,-7.62) 157(-15.8,-8.255) 158(-15.8,-8.89) 159(-15.8,-9.525) 160(-15.8,-10.16) 161(-15.8,-10.795) 162(-15.8,-11.43) 163(-15.8,-12.065) 164(-15.8,-12.7)
Top Overlay:
  lines w0.203: -16.3,14.752 -16.3,15.514 ; -16.286,14.752 -14.68,13.482 ; -16.286,15.514 -15.524,16.29 -14.762,16.29 ; -16.27,-14.782 -16.27,-15.544 -15.494,-16.306 ; -16.256,-14.782 -14.65,-13.512 ; -15.494,-16.32 -14.732,-16.32 ; -14.762,16.276 -13.492,14.67 ; -14.732,-16.306 -13.462,-14.7 -13.126,-14.7 ; -14.68,-13.442 -14.68,13.4 ; -13.442,14.68 13.4,14.68 ; 13.335,-14.655 13.335,-14.02 -13.126,-14.02 -13.126,-14.7 ; 13.462,-14.7 -13.126,-14.7 ; 13.482,14.68 14.752,16.286 ; 13.492,-14.67 14.762,-16.276 ; 14.67,13.492 16.276,14.762 ; 14.68,-13.482 16.286,-14.752 ; 14.68,-13.4 14.68,13.442 ; 14.752,16.3 15.514,16.3 ; 14.762,-16.29 15.524,-16.29 16.286,-15.514 ; 15.514,16.286 16.29,15.524 16.29,14.762 ; 16.3,-15.514 16.3,-14.752
  text "1" at -12.96,-13.93 h1.97
Mechanical 16:
  drawing of 328 lines, arcs and shapes, not listed
Mechanical 27:
  lines w0.2: -16.9,-16.9 -16.9,16.9 16.9,16.9 16.9,-16.9 -16.9,-16.9

## PQFP196 [mm]
pads (196):
  rect 0.35x1.8 smd: 1(-15.24,-18.3) 2(-14.605,-18.3) 3(-13.97,-18.3) 4(-13.335,-18.3) 5(-12.7,-18.3) 6(-12.065,-18.3) 7(-11.43,-18.3) 8(-10.795,-18.3) 9(-10.16,-18.3) 10(-9.525,-18.3) 11(-8.89,-18.3) 12(-8.255,-18.3) 13(-7.62,-18.3) 14(-6.985,-18.3) 15(-6.35,-18.3) 16(-5.715,-18.3) 17(-5.08,-18.3) 18(-4.445,-18.3) 19(-3.81,-18.3) 20(-3.175,-18.3) 21(-2.54,-18.3) 22(-1.905,-18.3) 23(-1.27,-18.3) 24(-0.635,-18.3) 25(0,-18.3) 26(0.635,-18.3) 27(1.27,-18.3) 28(1.905,-18.3) 29(2.54,-18.3) 30(3.175,-18.3) 31(3.81,-18.3) 32(4.445,-18.3) 33(5.08,-18.3) 34(5.715,-18.3) 35(6.35,-18.3) 36(6.985,-18.3) 37(7.62,-18.3) 38(8.255,-18.3) 39(8.89,-18.3) 40(9.525,-18.3) 41(10.16,-18.3) 42(10.795,-18.3) 43(11.43,-18.3) 44(12.065,-18.3) 45(12.7,-18.3) 46(13.335,-18.3) 47(13.97,-18.3) 48(14.605,-18.3) 49(15.24,-18.3) 99(15.24,18.3) 100(14.605,18.3) 101(13.97,18.3) 102(13.335,18.3) 103(12.7,18.3) 104(12.065,18.3) 105(11.43,18.3) 106(10.795,18.3) 107(10.16,18.3) 108(9.525,18.3) 109(8.89,18.3) 110(8.255,18.3) 111(7.62,18.3) 112(6.985,18.3) 113(6.35,18.3) 114(5.715,18.3) 115(5.08,18.3) 116(4.445,18.3) 117(3.81,18.3) 118(3.175,18.3) 119(2.54,18.3) 120(1.905,18.3) 121(1.27,18.3) 122(0.635,18.3) 123(0,18.3) 124(-0.635,18.3) 125(-1.27,18.3) 126(-1.905,18.3) 127(-2.54,18.3) 128(-3.175,18.3) 129(-3.81,18.3) 130(-4.445,18.3) 131(-5.08,18.3) 132(-5.715,18.3) 133(-6.35,18.3) 134(-6.985,18.3) 135(-7.62,18.3) 136(-8.255,18.3) 137(-8.89,18.3) 138(-9.525,18.3) 139(-10.16,18.3) 140(-10.795,18.3) 141(-11.43,18.3) 142(-12.065,18.3) 143(-12.7,18.3) 144(-13.335,18.3) 145(-13.97,18.3) 146(-14.605,18.3) 147(-15.24,18.3)
  rect 1.8x0.35 smd: 50(18.3,-15.24) 51(18.3,-14.605) 52(18.3,-13.97) 53(18.3,-13.335) 54(18.3,-12.7) 55(18.3,-12.065) 56(18.3,-11.43) 57(18.3,-10.795) 58(18.3,-10.16) 59(18.3,-9.525) 60(18.3,-8.89) 61(18.3,-8.255) 62(18.3,-7.62) 63(18.3,-6.985) 64(18.3,-6.35) 65(18.3,-5.715) 66(18.3,-5.08) 67(18.3,-4.445) 68(18.3,-3.81) 69(18.3,-3.175) 70(18.3,-2.54) 71(18.3,-1.905) 72(18.3,-1.27) 73(18.3,-0.635) 74(18.3,0) 75(18.3,0.635) 76(18.3,1.27) 77(18.3,1.905) 78(18.3,2.54) 79(18.3,3.175) 80(18.3,3.81) 81(18.3,4.445) 82(18.3,5.08) 83(18.3,5.715) 84(18.3,6.35) 85(18.3,6.985) 86(18.3,7.62) 87(18.3,8.255) 88(18.3,8.89) 89(18.3,9.525) 90(18.3,10.16) 91(18.3,10.795) 92(18.3,11.43) 93(18.3,12.065) 94(18.3,12.7) 95(18.3,13.335) 96(18.3,13.97) 97(18.3,14.605) 98(18.3,15.24) 148(-18.3,15.24) 149(-18.3,14.605) 150(-18.3,13.97) 151(-18.3,13.335) 152(-18.3,12.7) 153(-18.3,12.065) 154(-18.3,11.43) 155(-18.3,10.795) 156(-18.3,10.16) 157(-18.3,9.525) 158(-18.3,8.89) 159(-18.3,8.255) 160(-18.3,7.62) 161(-18.3,6.985) 162(-18.3,6.35) 163(-18.3,5.715) 164(-18.3,5.08) 165(-18.3,4.445) 166(-18.3,3.81) 167(-18.3,3.175) 168(-18.3,2.54) 169(-18.3,1.905) 170(-18.3,1.27) 171(-18.3,0.635) 172(-18.3,0) 173(-18.3,-0.635) 174(-18.3,-1.27) 175(-18.3,-1.905) 176(-18.3,-2.54) 177(-18.3,-3.175) 178(-18.3,-3.81) 179(-18.3,-4.445) 180(-18.3,-5.08) 181(-18.3,-5.715) 182(-18.3,-6.35) 183(-18.3,-6.985) 184(-18.3,-7.62) 185(-18.3,-8.255) 186(-18.3,-8.89) 187(-18.3,-9.525) 188(-18.3,-10.16) 189(-18.3,-10.795) 190(-18.3,-11.43) 191(-18.3,-12.065) 192(-18.3,-12.7) 193(-18.3,-13.335) 194(-18.3,-13.97) 195(-18.3,-14.605) 196(-18.3,-15.24)
Top Overlay:
  lines w0.203: -18.84,17.252 -18.84,18.014 ; -18.826,17.252 -17.22,15.982 ; -18.826,18.014 -18.064,18.79 -17.302,18.79 ; -18.81,-17.282 -18.81,-18.044 -18.034,-18.806 ; -18.796,-17.282 -17.19,-16.012 ; -18.034,-18.82 -17.272,-18.82 ; -17.302,18.776 -16.032,17.17 ; -17.272,-18.806 -16.002,-17.2 -15.666,-17.2 ; -17.22,-16.022 -17.22,15.9 ; -16.022,17.22 15.9,17.22 ; 15.875,-17.155 15.875,-16.52 -15.666,-16.52 -15.666,-17.2 ; 15.982,17.22 17.252,18.826 ; 16.002,-17.2 -15.666,-17.2 ; 16.032,-17.17 17.302,-18.776 ; 17.17,16.032 18.776,17.302 ; 17.22,-15.982 18.826,-17.252 ; 17.22,-15.9 17.22,16.022 ; 17.252,18.84 18.014,18.84 ; 17.302,-18.79 18.064,-18.79 18.826,-18.014 ; 18.014,18.826 18.79,18.064 18.79,17.302 ; 18.84,-18.014 18.84,-17.252
  text "1" at -15.5,-16.43 h1.08
Mechanical 16:
  drawing of 392 lines, arcs and shapes, not listed
Mechanical 27:
  lines w0.2: -19.9,-19.9 -19.9,19.9 19.9,19.9 19.9,-19.9 -19.9,-19.9

## PQFP244 [mm]
pads (244):
  rect 0.35x1.8 smd: 1(-19.05,-20.5) 2(-18.415,-20.5) 3(-17.78,-20.5) 4(-17.145,-20.5) 5(-16.51,-20.5) 6(-15.875,-20.5) 7(-15.24,-20.5) 8(-14.605,-20.5) 9(-13.97,-20.5) 10(-13.335,-20.5) 11(-12.7,-20.5) 12(-12.065,-20.5) 13(-11.43,-20.5) 14(-10.795,-20.5) 15(-10.16,-20.5) 16(-9.525,-20.5) 17(-8.89,-20.5) 18(-8.255,-20.5) 19(-7.62,-20.5) 20(-6.985,-20.5) 21(-6.35,-20.5) 22(-5.715,-20.5) 23(-5.08,-20.5) 24(-4.445,-20.5) 25(-3.81,-20.5) 26(-3.175,-20.5) 27(-2.54,-20.5) 28(-1.905,-20.5) 29(-1.27,-20.5) 30(-0.635,-20.5) 31(0,-20.5) 32(0.635,-20.5) 33(1.27,-20.5) 34(1.905,-20.5) 35(2.54,-20.5) 36(3.175,-20.5) 37(3.81,-20.5) 38(4.445,-20.5) 39(5.08,-20.5) 40(5.715,-20.5) 41(6.35,-20.5) 42(6.985,-20.5) 43(7.62,-20.5) 44(8.255,-20.5) 45(8.89,-20.5) 46(9.525,-20.5) 47(10.16,-20.5) 48(10.795,-20.5) 49(11.43,-20.5) 50(12.065,-20.5) 51(12.7,-20.5) 52(13.335,-20.5) 53(13.97,-20.5) 54(14.605,-20.5) 55(15.24,-20.5) 56(15.875,-20.5) 57(16.51,-20.5) 58(17.145,-20.5) 59(17.78,-20.5) 60(18.415,-20.5) 61(19.05,-20.5) 123(19.05,20.5) 124(18.415,20.5) 125(17.78,20.5) 126(17.145,20.5) 127(16.51,20.5) 128(15.875,20.5) 129(15.24,20.5) 130(14.605,20.5) 131(13.97,20.5) 132(13.335,20.5) 133(12.7,20.5) 134(12.065,20.5) 135(11.43,20.5) 136(10.795,20.5) 137(10.16,20.5) 138(9.525,20.5) 139(8.89,20.5) 140(8.255,20.5) 141(7.62,20.5) 142(6.985,20.5) 143(6.35,20.5) 144(5.715,20.5) 145(5.08,20.5) 146(4.445,20.5) 147(3.81,20.5) 148(3.175,20.5) 149(2.54,20.5) 150(1.905,20.5) 151(1.27,20.5) 152(0.635,20.5) 153(0,20.5) 154(-0.635,20.5) 155(-1.27,20.5) 156(-1.905,20.5) 157(-2.54,20.5) 158(-3.175,20.5) 159(-3.81,20.5) 160(-4.445,20.5) 161(-5.08,20.5) 162(-5.715,20.5) 163(-6.35,20.5) 164(-6.985,20.5) 165(-7.62,20.5) 166(-8.255,20.5) 167(-8.89,20.5) 168(-9.525,20.5) 169(-10.16,20.5) 170(-10.795,20.5) 171(-11.43,20.5) 172(-12.065,20.5) 173(-12.7,20.5) 174(-13.335,20.5) 175(-13.97,20.5) 176(-14.605,20.5) 177(-15.24,20.5) 178(-15.875,20.5) 179(-16.51,20.5) 180(-17.145,20.5) 181(-17.78,20.5) 182(-18.415,20.5) 183(-19.05,20.5)
  rect 1.8x0.35 smd: 62(20.5,-19.05) 63(20.5,-18.415) 64(20.5,-17.78) 65(20.5,-17.145) 66(20.5,-16.51) 67(20.5,-15.875) 68(20.5,-15.24) 69(20.5,-14.605) 70(20.5,-13.97) 71(20.5,-13.335) 72(20.5,-12.7) 73(20.5,-12.065) 74(20.5,-11.43) 75(20.5,-10.795) 76(20.5,-10.16) 77(20.5,-9.525) 78(20.5,-8.89) 79(20.5,-8.255) 80(20.5,-7.62) 81(20.5,-6.985) 82(20.5,-6.35) 83(20.5,-5.715) 84(20.5,-5.08) 85(20.5,-4.445) 86(20.5,-3.81) 87(20.5,-3.175) 88(20.5,-2.54) 89(20.5,-1.905) 90(20.5,-1.27) 91(20.5,-0.635) 92(20.5,0) 93(20.5,0.635) 94(20.5,1.27) 95(20.5,1.905) 96(20.5,2.54) 97(20.5,3.175) 98(20.5,3.81) 99(20.5,4.445) 100(20.5,5.08) 101(20.5,5.715) 102(20.5,6.35) 103(20.5,6.985) 104(20.5,7.62) 105(20.5,8.255) 106(20.5,8.89) 107(20.5,9.525) 108(20.5,10.16) 109(20.5,10.795) 110(20.5,11.43) 111(20.5,12.065) 112(20.5,12.7) 113(20.5,13.335) 114(20.5,13.97) 115(20.5,14.605) 116(20.5,15.24) 117(20.5,15.875) 118(20.5,16.51) 119(20.5,17.145) 120(20.5,17.78) 121(20.5,18.415) 122(20.5,19.05) 184(-20.5,19.05) 185(-20.5,18.415) 186(-20.5,17.78) 187(-20.5,17.145) 188(-20.5,16.51) 189(-20.5,15.875) 190(-20.5,15.24) 191(-20.5,14.605) 192(-20.5,13.97) 193(-20.5,13.335) 194(-20.5,12.7) 195(-20.5,12.065) 196(-20.5,11.43) 197(-20.5,10.795) 198(-20.5,10.16) 199(-20.5,9.525) 200(-20.5,8.89) 201(-20.5,8.255) 202(-20.5,7.62) 203(-20.5,6.985) 204(-20.5,6.35) 205(-20.5,5.715) 206(-20.5,5.08) 207(-20.5,4.445) 208(-20.5,3.81) 209(-20.5,3.175) 210(-20.5,2.54) 211(-20.5,1.905) 212(-20.5,1.27) 213(-20.5,0.635) 214(-20.5,0) 215(-20.5,-0.635) 216(-20.5,-1.27) 217(-20.5,-1.905) 218(-20.5,-2.54) 219(-20.5,-3.175) 220(-20.5,-3.81) 221(-20.5,-4.445) 222(-20.5,-5.08) 223(-20.5,-5.715) 224(-20.5,-6.35) 225(-20.5,-6.985) 226(-20.5,-7.62) 227(-20.5,-8.255) 228(-20.5,-8.89) 229(-20.5,-9.525) 230(-20.5,-10.16) 231(-20.5,-10.795) 232(-20.5,-11.43) 233(-20.5,-12.065) 234(-20.5,-12.7) 235(-20.5,-13.335) 236(-20.5,-13.97) 237(-20.5,-14.605) 238(-20.5,-15.24) 239(-20.5,-15.875) 240(-20.5,-16.51) 241(-20.5,-17.145) 242(-20.5,-17.78) 243(-20.5,-18.415) 244(-20.5,-19.05)
Top Overlay:
  lines w0.203: -19.431,19.4 19.476,19.4 ; -19.4,-19.431 -19.4,19.476 ; 19.05,-19.355 18.415,-18.72 -18.841,-18.72 -19.476,-19.4 19.431,-19.4 ; 19.4,-19.476 19.4,19.431
  text "1" at -18.167,-18.376 h2.76
Mechanical 16:
  drawing of 488 lines, arcs and shapes, not listed
Mechanical 27:
  lines w0.2: -21.9,-21.9 -21.9,21.9 21.9,21.9 21.9,-21.9 -21.9,-21.9

## R0402 [mm]
pads (2):
  rect 0.7x0.9 smd: 1(-0.65,0) 2(0.65,0)
Mechanical 6:
  rectangle: -0.2,-0.4 0.2,0.4
Mechanical 16:
  rectangle: -0.554,-0.305 -0.254,0.295
  rectangle: 0.259,-0.305 0.559,0.295
  lines w0.152: -0.245,-0.224 0.245,-0.224 ; -0.245,0.224 0.245,0.224
Mechanical 27:
  lines w0.051: -1.473,-0.483 1.473,-0.483 1.473,0.483 -1.473,0.483 -1.473,-0.483

## R0603 [mm]
pads (2):
  rect 1x1.1 smd: 1(-0.85,0) 2(0.85,0)
Mechanical 6:
  rectangle: -0.2,-0.4 0.2,0.4
Mechanical 16:
  rectangle: 0.432,-0.432 0.838,0.432
  rectangle: -0.838,-0.432 -0.432,0.432
  lines w0.152: -0.432,-0.356 0.432,-0.356 ; -0.432,0.356 0.432,0.356
Mechanical 27:
  lines w0.051: -1.473,-0.983 1.473,-0.983 1.473,0.983 -1.473,0.983 -1.473,-0.983

## R0805 [mm]
pads (2):
  rect 1.3x1.5 smd: 1(-0.95,0) 2(0.95,0)
Mechanical 6:
  rectangle: -0.2,-0.5 0.2,0.5
Mechanical 16:
  rectangle: 0.406,-0.699 1.056,0.702
  rectangle: -1.067,-0.699 -0.417,0.702
  lines w0.152: -0.41,-0.635 0.41,-0.635 ; -0.41,0.635 0.41,0.635
Mechanical 27:
  lines w0.051: -1.973,-0.983 1.973,-0.983 1.973,0.983 -1.973,0.983 -1.973,-0.983

## R0805W [mm]
pads (2):
  rect 1.5x1 smd: 1(-1.053,0) 2(1.053,0)
Mechanical 6:
  rectangle: -0.2,-0.5 0.2,0.5
Mechanical 16:
  rectangle: 0.406,-0.699 1.056,0.702
  rectangle: -1.067,-0.699 -0.417,0.702
  lines w0.152: -0.41,-0.635 0.41,-0.635 ; -0.41,0.635 0.41,0.635
Mechanical 27:
  lines w0.051: -1.973,-0.983 1.973,-0.983 1.973,0.983 -1.973,0.983 -1.973,-0.983